# Altium footprint library 针式电感.PcbLib: 75 footprints (part 4 of 5)
Each footprint in its own frame and in the unit in brackets; x right, y up, seen from the top. Pads: shape width x height; smd on the part's side, far side on the other; paste and mask are expansions set on the pad; w line width, h text height; cw(c..) or ccw(c..) is an arc to the next point about the centre after c.
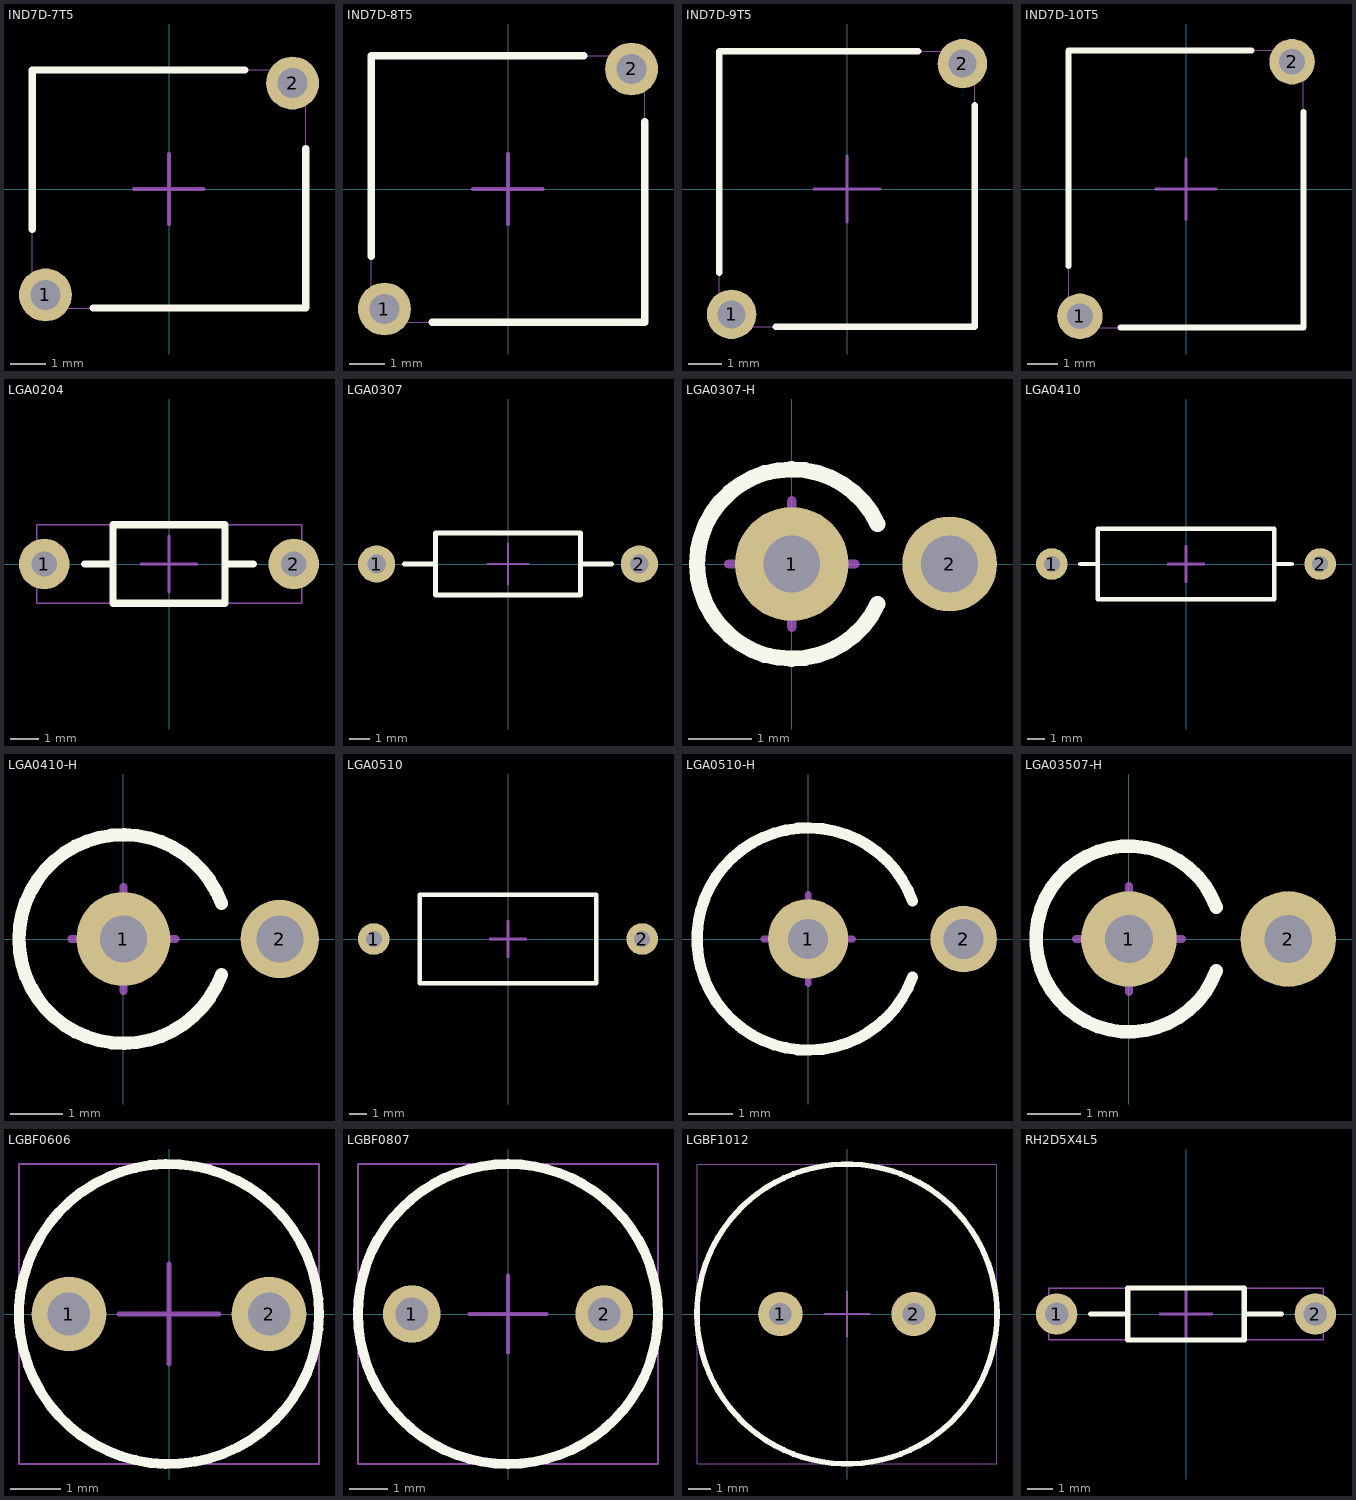
[diagram p3: the footprints below, top view; thin cyan lines are the x and y axes]

## IND7D-7T5 [mm] "空芯线圈"
height 6.8
pads (2):
  round 1.5 hole 0.85 unplated: 1(-3.5,-3) 2(3.5,3)
Top Overlay:
  lines w0.2: -3.875,-1.143 -3.875,3.375 2.159,3.375 ; -2.159,-3.375 3.875,-3.375 3.875,1.143
Mechanical 13:
  lines w0.01: -3.875,-3.375 -3.875,3.375 3.875,3.375 3.875,-3.375 -3.875,-3.375
Mechanical 15:
  lines w0.1: -1,0 0.991,0 ; 0,-1 0,1
3D body: height 8.12, standoff -2.76, extent -3.875,-3.375 3.875,3.375

## IND7D-8T5 [mm] "空芯线圈"
height 6.8
pads (2):
  round 1.5 hole 0.85 unplated: 1(-3.5,-3.4) 2(3.5,3.4)
Top Overlay:
  lines w0.2: -3.875,-1.905 -3.875,3.775 2.159,3.775 ; -2.159,-3.775 3.875,-3.775 3.875,1.905
Mechanical 13:
  lines w0.01: -3.875,-3.775 -3.875,3.775 3.875,3.775 3.875,-3.775 -3.875,-3.775
Mechanical 15:
  lines w0.1: -1,0 0.991,0 ; 0,-1 0,1
3D body: height 8.12, standoff -2.76, extent -3.875,-3.775 3.875,3.775

## IND7D-9T5 [mm] "空芯线圈"
height 6.8
pads (2):
  round 1.5 hole 0.85 unplated: 1(-3.5,-3.8) 2(3.5,3.8)
Top Overlay:
  lines w0.2: -3.875,-2.54 -3.875,4.175 2.159,4.175 ; -2.159,-4.175 3.875,-4.175 3.875,2.54
Mechanical 13:
  lines w0.01: -3.875,-4.175 -3.875,4.175 3.875,4.175 3.875,-4.175 -3.875,-4.175
Mechanical 15:
  lines w0.1: -1,0 0.991,0 ; 0,-1 0,1
3D body: height 8.12, standoff -2.76, extent -3.875,-4.175 3.875,4.175

## IND7D-10T5 [mm] "空芯线圈"
height 6.8
pads (2):
  round 1.5 hole 0.85 unplated: 1(-3.5,-4.2) 2(3.5,4.2)
Top Overlay:
  lines w0.2: -3.875,-2.54 -3.875,4.575 2.159,4.575 ; -2.159,-4.575 3.875,-4.575 3.875,2.54
Mechanical 13:
  lines w0.01: -3.875,-4.575 -3.875,4.575 3.875,4.575 3.875,-4.575 -3.875,-4.575
Mechanical 15:
  lines w0.1: -1,0 0.991,0 ; 0,-1 0,1
3D body: height 8.12, standoff -2.76, extent -3.875,-4.575 3.875,4.575

## LGA0204 [mm] "鸿元电感 LGA系列"
height 2.8
pads (2):
  round 1.8 hole 0.9: 1(-4.445,0) 2(4.445,0)
Top Overlay:
  lines w0.254: -3,0 -2,0 ; 2,0 3,0 ; -2,-1.4 2,-1.4 2,1.4 -2,1.4 -2,-1.4
Mechanical 13:
  lines w0.05: -4.706,-1.405 -4.706,1.405 4.724,1.405 4.724,-1.405 -4.706,-1.405
Mechanical 15:
  lines w0.1: -1,0 0.991,0 ; 0,-1 0,1
3D body: height 3.41, standoff -4.5, extent -4.706,-1.405 4.724,1.405

## LGA0307 [mm] "鸿元电感 LGA系列"
height 3
pads (2):
  round 1.8 hole 0.9: 1(-6.35,0) 2(6.35,0)
Top Overlay:
  lines w0.254: -5,0 -3.5,0 ; 3.5,0 5,0 ; -3.5,-1.5 3.5,-1.5 3.5,1.5 -3.5,1.5 -3.5,-1.5
Mechanical 15:
  lines w0.1: -1,0 1,0 ; 0,-1 0,1

## LGA0307-H [mm] "鸿元电感 LGA系列"
height 5
pads (2):
  round 1.8 hole 0.9: 1(0,0)
  round 1.5 hole 0.9: 2(2.5,0)
Top Overlay:
  lines w0.254: 1.359,-0.634 cw(c0,0) 1.359,0.634
Mechanical 15:
  lines w0.15: -1,0 1,0 ; 0,-1 0,1

## LGA0410 [mm] "鸿元电感 LGA系列"
height 4
pads (2):
  round 1.8 hole 0.9: 1(-7.62,0) 2(7.62,0)
Top Overlay:
  lines w0.254: -6,0 -5,0 ; 5,0 6,0 ; -5,-2 5,-2 5,2 -5,2 -5,-2
Mechanical 15:
  lines w0.15: -1,0 1,0 ; 0,-1 0,1

## LGA0410-H [mm] "鸿元电感 LGA系列"
height 5
pads (2):
  round 1.8 hole 0.9: 1(0,0)
  round 1.5 hole 0.9: 2(3,0)
Top Overlay:
  lines w0.254: 1.879,-0.684 cw(c0,0) 1.879,0.684
Mechanical 15:
  lines w0.15: -1,0 1,0 ; 0,-1 0,1

## LGA0510 [mm] "鸿元电感 LGA系列"
height 5
pads (2):
  round 1.8 hole 0.9: 1(-7.62,0) 2(7.62,0)
Top Overlay:
  lines w0.254: -5,-2.5 5,-2.5 5,2.5 -5,2.5 -5,-2.5
Mechanical 15:
  lines w0.15: -1,0 1,0 ; 0,-1 0,1

## LGA0510-H [mm] "鸿元电感 LGA系列"
height 14
pads (2):
  round 1.8 hole 0.9: 1(0,0)
  round 1.5 hole 0.9: 2(3.5,0)
Top Overlay:
  lines w0.254: 2.349,-0.855 cw(c0,0) 2.349,0.855
Mechanical 15:
  lines w0.15: -1,0 1,0 ; 0,-1 0,1

## LGA03507-H [mm] "鸿元电感 LGA系列"
height 5
pads (2):
  round 1.8 hole 0.9: 1(0,0) 2(3,0)
Top Overlay:
  lines w0.254: 1.644,-0.599 cw(c0,0) 1.644,0.599
Mechanical 15:
  lines w0.15: -1,0 1,0 ; 0,-1 0,1

## LGBF0606 [mm] "蔽磁功率电感"
height 6.5
pads (2):
  round 1.5 hole 0.85 unplated: 1(-2,0) 2(2,0)
Top Overlay:
  circle w0.2: c0,0 r3
Mechanical 13:
  lines w0.05: -3,-3 -3,3 3,3 3,-3 -3,-3
Mechanical 15:
  lines w0.1: -1,0 1,0 ; 0,-1 0,1
3D body: height 6.71, standoff -3.3, extent -3,-3 3,3

## LGBF0807 [mm] "蔽磁功率电感"
height 7.5
pads (2):
  round 1.5 hole 0.85 unplated: 1(-2.5,0) 2(2.5,0)
Top Overlay:
  circle w0.254: c0,0 r3.9
Mechanical 13:
  lines w0.05: -3.9,-3.9 -3.9,3.9 3.9,3.9 3.9,-3.9 -3.9,-3.9
Mechanical 15:
  lines w0.1: -1,0 1,0 ; 0,-1 0,1
3D body: height 7.7, standoff -3.3, extent -3.9,-3.9 3.9,3.9

## LGBF1012 [mm] "蔽磁功率电感"
height 11
pads (2):
  round 2 hole 1 unplated: 1(-3,0) 2(3,0)
Top Overlay:
  circle w0.254: c0,0 r6.75
Mechanical 13:
  lines w0.05: -6.75,-6.75 6.75,-6.75 6.75,6.75 -6.75,6.75 -6.75,-6.75
Mechanical 15:
  lines w0.1: -1,0 1,0 ; 0,-1 0,1
3D body: height 11.2, standoff -3.3, extent -6.75,-6.75 6.75,6.75

## RH2D5X4L5 [mm] "穿心磁珠"
height 2.5
pads (2):
  round 1.6 hole 0.9: 1(-5,0) 2(5,0)
Top Overlay:
  lines w0.2: -3.683,0 -2.25,0 ; 2.25,0 3.683,0 ; -2.25,-1 2.25,-1 2.25,1 -2.25,1 -2.25,-1
Mechanical 13:
  lines w0.05: -5.3,-1 5.3,-1 5.3,1 -5.3,1 -5.3,-1
Mechanical 15:
  lines w0.1: -1,0 1,0 ; 0,-1 0,1
3D body: height 2.5, standoff -3, extent -5.3,-1 5.3,1